# Altium footprint library aiskylab-01Resistors.PcbLib: 208 footprints (part 8 of 13)
Each footprint in its own frame and in the unit in brackets; x right, y up, seen from the top. Pads: shape width x height; smd on the part's side, far side on the other; paste and mask are expansions set on the pad; w line width, h text height; cw(c..) or ccw(c..) is an arc to the next point about the centre after c.
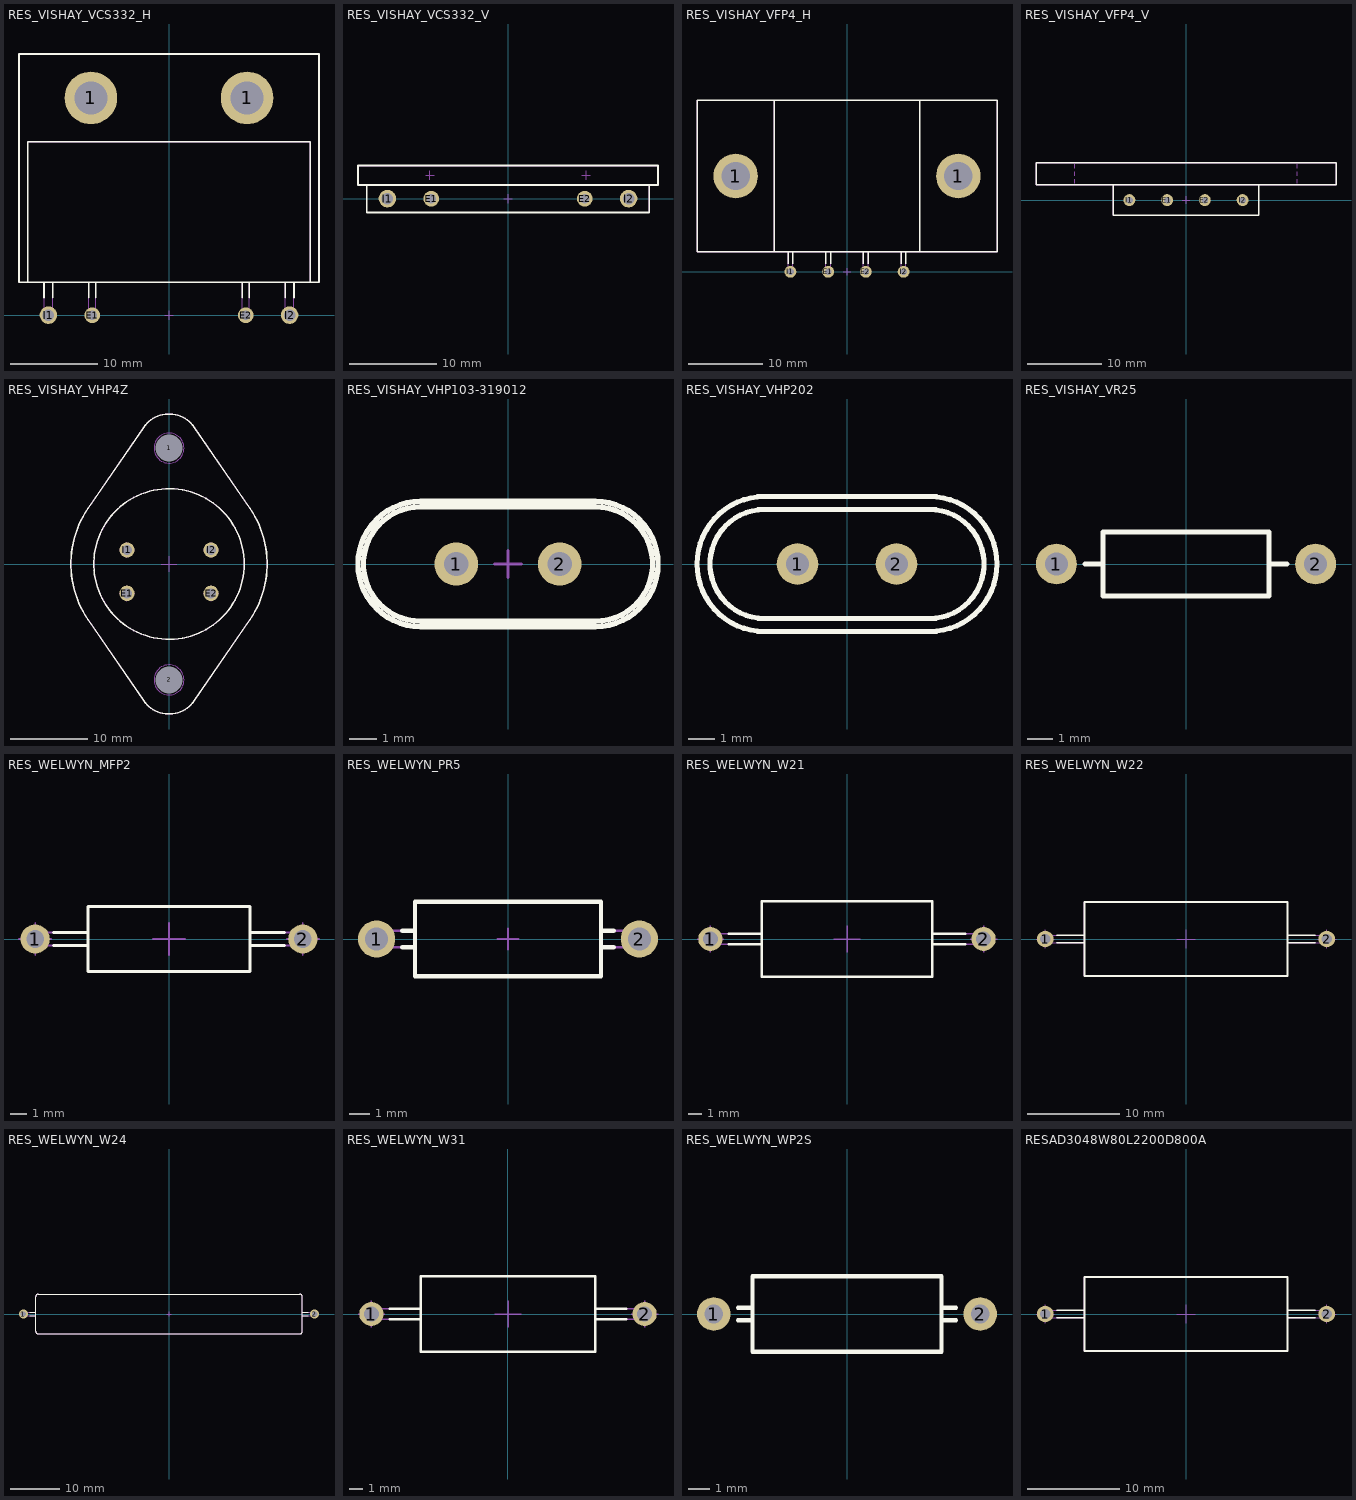
[diagram p7: the footprints below, top view; thin cyan lines are the x and y axes]

## RES_VISHAY_VCS332_H [mm] "4 Leads VISHAY VCS332 Case - Horizontal Mounting"
height 5.33
pads (6):
  round 6 hole 3.8: 1(-8.9,24.765) 1(8.9,24.765)
  round 1.8 hole 1.1: E1(-8.75,0) E2(8.75,0)
  round 2 hole 1.3: I1(-13.75,0) I2(13.75,0)
Top Overlay:
  lines w0.2: -16.1,3.765 -16.1,19.765 16.1,19.765 16.1,3.765 ; -14.25,2 -14.25,3.765 ; -13.25,2 -13.25,3.765 ; -9.15,2 -9.15,3.765 ; -8.35,2 -8.35,3.765 ; 8.35,2 8.35,3.765 ; 9.15,2 9.15,3.765 ; 13.25,2 13.25,3.765 ; 14.25,2 14.25,3.765 ; -17.1,3.765 17.1,3.765 17.1,29.765 -17.1,29.765 -17.1,3.765
Top Designator:
  text ".Designator" at -7.618,13.874 h1.52
Top Assembly:
  circle w0.1: c-8.9,24.765 r1.75
  circle w0.1: c8.9,24.765 r1.75
  lines w0.1: -16.1,3.765 -16.1,19.765 16.1,19.765 16.1,3.765 ; -14.25,3.765 -14.25,0 ccw(c-13.75,0) -13.25,0 -13.25,3.765 ; -9.15,3.765 -9.15,0 ccw(c-8.75,0) -8.35,0 -8.35,3.765 ; 8.35,3.765 8.35,0 ccw(c8.75,0) 9.15,0 9.15,3.765 ; 13.25,3.765 13.25,0 ccw(c13.75,0) 14.25,0 14.25,3.765 ; -17.1,3.765 -17.1,29.765 17.1,29.765 17.1,3.765 -17.1,3.765
Top Dimensions:
  lines w0.1: -14.25,0 -13.75,0 ; -13.75,-0.5 -13.75,0 ; -13.75,0.5 -13.75,0 ; -13.25,0 -13.75,0 ; -9.4,24.765 -8.9,24.765 ; -9.25,0 -8.75,0 ; -8.9,24.265 -8.9,24.765 ; -8.9,25.265 -8.9,24.765 ; -8.75,-0.5 -8.75,0 ; -8.75,0.5 -8.75,0 ; -8.4,24.765 -8.9,24.765 ; -8.25,0 -8.75,0 ; -0.5,0 0,0 ; 0,-0.5 0,0 ; 0,0.5 0,0 ; 0.5,0 0,0 ; 8.25,0 8.75,0 ; 8.4,24.765 8.9,24.765 ; 8.75,-0.5 8.75,0 ; 8.75,0.5 8.75,0 ; 8.9,24.265 8.9,24.765 ; 8.9,25.265 8.9,24.765 ; 9.25,0 8.75,0 ; 9.4,24.765 8.9,24.765 ; 13.25,0 13.75,0 ; 13.75,-0.5 13.75,0 ; 13.75,0.5 13.75,0 ; 14.25,0 13.75,0
3D body "v200-130.stp": height 0.02, standoff -1.65, extent 12.75,-1 14.75,1
3D body "v200-130.stp": height 0.02, standoff -1.65, extent 7.75,-1 9.75,1
3D body "v200-130.stp": height 0.02, standoff -1.65, extent -14.7,-1.075 -12.7,0.925
3D body "v200-130.stp": height 0.02, standoff -1.65, extent -9.75,-1 -7.75,1
3D body "RES_VISHAY_VCS332_h.stp": height 5.33, standoff -3.6, extent -17.1,-0.5 17.1,29.765

## RES_VISHAY_VCS332_V [mm] "4 Leads VISHAY VCS332 Case - Vertical Mounting"
height 31
pads (4):
  round 1.8 hole 1.1: E1(-8.75,0) E2(8.75,0)
  round 2 hole 1.3: I1(-13.75,0) I2(13.75,0)
Top Overlay:
  lines w0.2: -16.1,1.565 -16.1,-1.565 16.1,-1.565 16.1,1.565 ; -17.1,1.565 17.1,1.565 17.1,3.765 -17.1,3.765 -17.1,1.565
Top Designator:
  text ".Designator" at -7.618,0.592 h1.52
Top Assembly:
  lines w0.1: -16.1,1.565 -16.1,-1.565 16.1,-1.565 16.1,1.565 ; -17.1,1.565 -17.1,3.765 17.1,3.765 17.1,1.565 -17.1,1.565
Top Dimensions:
  lines w0.1: -14.25,0 -13.75,0 ; -13.75,-0.5 -13.75,0 ; -13.75,0.5 -13.75,0 ; -13.25,0 -13.75,0 ; -9.4,2.665 -8.9,2.665 ; -9.25,0 -8.75,0 ; -8.9,2.165 -8.9,2.665 ; -8.9,3.165 -8.9,2.665 ; -8.75,-0.5 -8.75,0 ; -8.75,0.5 -8.75,0 ; -8.4,2.665 -8.9,2.665 ; -8.25,0 -8.75,0 ; -0.5,0 0,0 ; 0,-0.5 0,0 ; 0,0.5 0,0 ; 0.5,0 0,0 ; 8.25,0 8.75,0 ; 8.4,2.665 8.9,2.665 ; 8.75,-0.5 8.75,0 ; 8.75,0.5 8.75,0 ; 8.9,2.165 8.9,2.665 ; 8.9,3.165 8.9,2.665 ; 9.25,0 8.75,0 ; 9.4,2.665 8.9,2.665 ; 13.25,0 13.75,0 ; 13.75,-0.5 13.75,0 ; 13.75,0.5 13.75,0 ; 14.25,0 13.75,0
3D body "v200-130.stp": height 0.02, standoff -1.65, extent -14.75,-1 -12.75,1
3D body "v200-130.stp": height 0.02, standoff -1.65, extent 12.75,-1 14.75,1
3D body "v200-130.stp": height 0.02, standoff -1.65, extent 7.75,-1 9.75,1
3D body "v200-130.stp": height 0.02, standoff -1.65, extent -9.75,-1 -7.75,1
3D body "RES_VISHAY_VCS332_v.stp": height 31, standoff -3.6, extent -17.1,-1.565 17.1,3.765

## RES_VISHAY_VFP4_H [mm] "4 Leads VFP4 VISHAY Case - Horizontal Mounting"
height 7.11
pads (6):
  round 6 hole 3.8: 1(-15,12.9) 1(15,12.9)
  round 1.6 hole 0.9: E1(-2.54,0) E2(2.54,0) I1(-7.62,0) I2(7.62,0)
Top Overlay:
  lines w0.2: -9.79,2.7 -9.79,23.1 ; -7.945,1.051 -7.945,2.7 ; -7.295,1.051 -7.295,2.7 ; -2.865,1.051 -2.865,2.7 ; -2.215,1.051 -2.215,2.7 ; 2.215,1.051 2.215,2.7 ; 2.865,1.051 2.865,2.7 ; 7.295,1.051 7.295,2.7 ; 7.945,1.051 7.945,2.7 ; 9.79,2.7 9.79,23.1 ; -20.21,2.7 -20.21,23.1 20.21,23.1 20.21,2.7 -20.21,2.7
Top Designator:
  text ".Designator" at -7.618,10.555 h1.52
Top Assembly:
  lines w0.1: -9.79,2.7 -9.79,23.1 ; -7.945,2.7 -7.945,0 ccw(c-7.62,0) -7.295,0 -7.295,2.7 ; -2.865,2.7 -2.865,0 ccw(c-2.54,0) -2.215,0 -2.215,2.7 ; 2.215,2.7 2.215,0 ccw(c2.54,0) 2.865,0 2.865,2.7 ; 7.295,2.7 7.295,0 ccw(c7.62,0) 7.945,0 7.945,2.7 ; 9.79,2.7 9.79,23.1 ; -20.21,2.7 -20.21,23.1 20.21,23.1 20.21,2.7 -20.21,2.7
Top Dimensions:
  lines w0.1: -15.5,12.9 -15,12.9 ; -15,12.4 -15,12.9 ; -15,13.4 -15,12.9 ; -14.5,12.9 -15,12.9 ; -8.12,0 -7.62,0 ; -7.62,-0.5 -7.62,0 ; -7.62,0.5 -7.62,0 ; -7.12,0 -7.62,0 ; -3.04,0 -2.54,0 ; -2.54,-0.5 -2.54,0 ; -2.54,0.5 -2.54,0 ; -2.04,0 -2.54,0 ; -0.5,0 0,0 ; 0,-0.5 0,0 ; 0,0.5 0,0 ; 0.5,0 0,0 ; 2.04,0 2.54,0 ; 2.54,-0.5 2.54,0 ; 2.54,0.5 2.54,0 ; 3.04,0 2.54,0 ; 7.12,0 7.62,0 ; 7.62,-0.5 7.62,0 ; 7.62,0.5 7.62,0 ; 8.12,0 7.62,0 ; 14.5,12.9 15,12.9 ; 15,12.4 15,12.9 ; 15,13.4 15,12.9 ; 15.5,12.9 15,12.9
3D body "v200-130.stp": height 0.02, standoff -1.65, extent -3.54,-1 -1.54,1
3D body "v200-130.stp": height 0.02, standoff -1.65, extent -8.62,-1 -6.62,1
3D body "v200-130.stp": height 0.02, standoff -1.65, extent 1.45,-1.075 3.45,0.925
3D body "v200-130.stp": height 0.02, standoff -1.65, extent 6.62,-1 8.62,1
3D body "RES_VISHAY_VFP-4_h.stp": height 7.11, standoff -3.6, extent -20.21,-0.325 20.21,23.1

## RES_VISHAY_VFP4_V [mm] "4 Leads VFP4 VISHAY Case - Vertical Mounting"
height 25.4
pads (4):
  round 1.6 hole 0.9: E1(-2.54,0) E2(2.54,0) I1(-7.62,0) I2(7.62,0)
Top Overlay:
  lines w0.2: -9.79,2.055 -9.79,-2.055 9.79,-2.055 9.79,2.055 ; -20.21,2.055 20.21,2.055 20.21,5.055 -20.21,5.055 -20.21,2.055
Top Designator:
  text ".Designator" at -7.618,0.992 h1.52
Top Assembly:
  lines w0.1: -9.79,2.055 -9.79,-2.055 9.79,-2.055 9.79,2.055 ; -20.21,2.055 -20.21,5.055 20.21,5.055 20.21,2.055 -20.21,2.055
Top Dimensions:
  lines w0.1: -15,2.305 -15,2.805 ; -15,3.305 -15,3.555 -15,3.805 ; -15,4.305 -15,4.805 ; -8.12,0 -7.62,0 ; -7.62,-0.5 -7.62,0 ; -7.62,0.5 -7.62,0 ; -7.12,0 -7.62,0 ; -3.04,0 -2.54,0 ; -2.54,-0.5 -2.54,0 ; -2.54,0.5 -2.54,0 ; -2.04,0 -2.54,0 ; -0.5,0 0,0 ; 0,-0.5 0,0 ; 0,0.5 0,0 ; 0.5,0 0,0 ; 2.04,0 2.54,0 ; 2.54,-0.5 2.54,0 ; 2.54,0.5 2.54,0 ; 3.04,0 2.54,0 ; 7.12,0 7.62,0 ; 7.62,-0.5 7.62,0 ; 7.62,0.5 7.62,0 ; 8.12,0 7.62,0 ; 15,2.305 15,2.805 ; 15,3.305 15,3.555 15,3.805 ; 15,4.305 15,4.805
3D body "v200-130.stp": height 0.02, standoff -1.65, extent -3.54,-1 -1.54,1
3D body "v200-130.stp": height 0.02, standoff -1.65, extent -8.62,-1 -6.62,1
3D body "v200-130.stp": height 0.02, standoff -1.65, extent 1.54,-1 3.54,1
3D body "v200-130.stp": height 0.02, standoff -1.65, extent 6.62,-1 8.62,1
3D body "RES_VISHAY_VFP-4_v.stp": height 25.4, standoff -3, extent -20.21,-2.055 20.21,5.055

## RES_VISHAY_VHP4Z [mm] "TO-3, 4 Leads VISHAY Case"
height 8.64
pads (6):
  round 1 hole 3.5 unplated: 1(0,15.065) 2(0,-15.065)
  round 2 hole 1.3: E1(-5.46,-3.815) E2(5.46,-3.815) I1(-5.46,1.825) I2(5.46,1.825)
Top Overlay:
  circle w0.2: c0,0 r9.779
  lines w0.2: -10.526,-7.221 cw(c0,0) -10.526,7.221 -3.299,17.758 cw(c0,15.495) 3.299,17.758 10.526,7.221 cw(c0,0) 10.526,-7.221 3.299,-17.758 cw(c0,-15.495) -3.299,-17.758 -10.526,-7.221
Top Designator:
  text ".Designator" at -7.618,-0.508 h1.52
Top Assembly:
  circle w0.1: c-5.46,-3.815 r0.5
  circle w0.1: c-5.46,1.825 r0.5
  circle w0.1: c5.46,-3.815 r0.5
  circle w0.1: c5.46,1.825 r0.5
  circle w0.1: c0,-15.065 r1.95
  circle w0.1: c0,15.065 r1.95
  circle w0.1: c0,0 r9.779
  lines w0.1: -10.526,-7.221 cw(c0,0) -10.526,7.221 -3.299,17.758 cw(c0,15.495) 3.299,17.758 10.526,7.221 cw(c0,0) 10.526,-7.221 3.299,-17.758 cw(c0,-15.495) -3.299,-17.758 -10.526,-7.221
Top Dimensions:
  lines w0.1: -6.46,-3.815 -5.46,-3.815 ; -6.46,1.825 -5.46,1.825 ; -5.46,-4.815 -5.46,-3.815 ; -5.46,-2.815 -5.46,-3.815 ; -5.46,0.825 -5.46,1.825 ; -5.46,2.825 -5.46,1.825 ; -4.46,-3.815 -5.46,-3.815 ; -4.46,1.825 -5.46,1.825 ; -1,-15.065 0,-15.065 ; -1,0 0,0 ; -1,15.065 0,15.065 ; 0,-16.065 0,-15.065 ; 0,-14.065 0,-15.065 ; 0,-1 0,0 ; 0,1 0,0 ; 0,14.065 0,15.065 ; 0,16.065 0,15.065 ; 1,-15.065 0,-15.065 ; 1,0 0,0 ; 1,15.065 0,15.065 ; 4.46,-3.815 5.46,-3.815 ; 4.46,1.825 5.46,1.825 ; 5.46,-4.815 5.46,-3.815 ; 5.46,-2.815 5.46,-3.815 ; 5.46,0.825 5.46,1.825 ; 5.46,2.825 5.46,1.825 ; 6.46,-3.815 5.46,-3.815 ; 6.46,1.825 5.46,1.825
3D body "v200-130.stp": height 0.02, standoff -1.65, extent -6.46,-4.815 -4.46,-2.815
3D body "v200-130.stp": height 0.02, standoff -1.65, extent -6.46,0.825 -4.46,2.825
3D body "v200-130.stp": height 0.02, standoff -1.65, extent 4.46,-4.815 6.46,-2.815
3D body "v200-130.stp": height 0.02, standoff -1.65, extent 4.46,0.825 6.46,2.825
3D body "RES_VISHAY_VHP4Z.stp": height 8.64, standoff -11.43, extent -12.765,-19.495 12.765,19.495

## RES_VISHAY_VHP103-319012 [mm] "Resistor, Radial, Pad spacing 5.08mm - Body 4.62mm X 11.05mm X 10.92mm H"
height 13.97
pads (2):
  round 1.6 hole 0.9: 1(-1.905,0) 2(1.905,0)
Top Overlay:
  lines w0.2: -3.215,-2.31 cw(c-3.215,0) -3.215,2.31 3.215,2.31 cw(c3.215,0) 3.215,-2.31 -3.215,-2.31 ; -3.215,-2.11 cw(c-3.215,0) -3.215,2.11 3.215,2.11 cw(c3.215,0) 3.215,-2.11 -3.215,-2.11
Top Designator:
  text ".Designator" at -7.618,-0.508 h1.52
Top Assembly:
  lines w0.1: -3.215,-2.31 cw(c-3.215,0) -3.215,2.31 3.215,2.31 cw(c3.215,0) 3.215,-2.31 -3.215,-2.31 ; -3.215,-2.11 cw(c-3.215,0) -3.215,2.11 3.215,2.11 cw(c3.215,0) 3.215,-2.11 -3.215,-2.11
Top Dimensions:
  lines w0.1: -2.395,0 -1.895,0 ; -1.895,-0.5 -1.895,0 ; -1.895,0.5 -1.895,0 ; -1.395,0 -1.895,0 ; -0.5,0 0,0 ; 0,-0.5 0,0 ; 0,0.5 0,0 ; 0.5,0 0,0 ; 1.395,0 1.895,0 ; 1.895,-0.5 1.895,0 ; 1.895,0.5 1.895,0 ; 2.395,0 1.895,0
3D body "v200-130.stp": height 0.02, standoff -1.65, extent 0.905,-1 2.905,1
3D body "v200-130.stp": height 0.02, standoff -1.65, extent -2.905,-1 -0.905,1
3D body "RES_VISHAY_VHP103-319012.stp": height 13.97, standoff -3.16, extent -5.525,-2.31 5.525,2.31

## RES_VISHAY_VHP202 [mm] "Resistor, Radial, Pad spacing 3.81mm - Body 5.21mm X 11.56mm X 13.84mm H"
height 11.43
pads (2):
  round 1.6 hole 0.9: 1(-1.905,0) 2(1.905,0)
Top Overlay:
  lines w0.2: -3.175,-2.6 cw(c-3.175,0) -3.175,2.6 3.175,2.6 cw(c3.175,0) 3.175,-2.6 -3.175,-2.6 ; -3.175,-2.1 cw(c-3.175,0) -3.175,2.1 3.175,2.1 cw(c3.175,0) 3.175,-2.1 -3.175,-2.1
Top Designator:
  text ".Designator" at -7.618,-0.508 h1.52
Top Assembly:
  circle w0.1: c-1.905,0 r0.6
  circle w0.1: c1.905,0 r0.6
  lines w0.1: -3.175,-2.6 cw(c-3.175,0) -3.175,2.6 3.175,2.6 cw(c3.175,0) 3.175,-2.6 -3.175,-2.6 ; -3.175,-2.1 cw(c-3.175,0) -3.175,2.1 3.175,2.1 cw(c3.175,0) 3.175,-2.1 -3.175,-2.1
3D body "v200-130.stp": height 0.02, standoff -1.65, extent 0.905,-1 2.905,1
3D body "v200-130.stp": height 0.02, standoff -1.65, extent -2.905,-1 -0.905,1
3D body "RES_VISHAY_VHP202.stp": height 13.84, standoff -3.6, extent -5.78,-2.6 5.77,2.6

## RES_VISHAY_VR25 [mm] "Resistor, Axial, Pad spacing 10.16 mm - Body Lengh 6.5mm X Body Diameter 2.5mm"
height 2.5
pads (2):
  round 1.6 hole 0.9: 1(-5.08,0) 2(5.08,0)
Top Overlay:
  lines w0.2: -3.95,0 -3.25,0 ; 3.25,0 3.95,0 ; -3.25,-1.25 3.25,-1.25 3.25,1.25 -3.25,1.25 -3.25,-1.25
Top Designator:
  text ".Designator" at -7.617,-0.508 h1.52
Top Assembly:
  lines w0.1: -3.95,0 -3.25,0 ; 3.25,0 3.95,0 ; -3.25,-1.25 -3.25,1.25 3.25,1.25 3.25,-1.25 -3.25,-1.25
3D body "v200-130.stp": height 0.02, standoff -1.65, extent -6.08,-1 -4.08,1
3D body "v200-130.stp": height 0.02, standoff -1.65, extent 4.08,-1 6.08,1
3D body "RES_VISHAY_VR25.stp": height 2.51, standoff -3.2, extent -5.38,-1.27 5.38,1.26

## RES_WELWYN_MFP2 [mm] "Resistor, Axial, Pad spacing 16.51 mm - Body Lengh 10mm X Body Diameter 4mm"
height 4
pads (2):
  round 1.8 hole 1.1: 1(-8.255,0) 2(8.255,0)
Top Overlay:
  lines w0.2: -7.124,-0.4 -5,-0.4 ; -7.124,0.4 -5,0.4 ; 5,-0.4 7.124,-0.4 ; 5,0.4 7.124,0.4 ; -5,-2 5,-2 5,2 -5,2 -5,-2
Top Designator:
  text ".Designator" at -7.618,-0.508 h1.52
Top Assembly:
  lines w0.1: -5,-0.4 -8.255,-0.4 cw(c-8.255,0) -8.255,0.4 -5,0.4 ; 5,-0.4 8.255,-0.4 ccw(c8.255,0) 8.255,0.4 5,0.4 ; -5,-2 -5,2 5,2 5,-2 -5,-2
Top Dimensions:
  lines w0.1: -9.255,0 -8.255,0 ; -8.255,-1 -8.255,0 ; -8.255,1 -8.255,0 ; -7.255,0 -8.255,0 ; -1,0 0,0 ; 0,-1 0,0 ; 0,1 0,0 ; 1,0 0,0 ; 7.255,0 8.255,0 ; 8.255,-1 8.255,0 ; 8.255,1 8.255,0 ; 9.255,0 8.255,0
3D body "v200-130.stp": height 0.02, standoff -1.65, extent 7.255,-1 9.255,1
3D body "v200-130.stp": height 0.02, standoff -1.65, extent -9.255,-1 -7.255,1
3D body "RES_WELWYN_MFP2.stp": height 4, standoff -3.1, extent -8.645,-1.95 8.665,2.05

## RES_WELWYN_PR5 [mm] "Resistor, Axial, Pad spacing 12.7mm - Body Lengh 9mm X Body Diameter 3.6mm"
height 3.6
pads (2):
  round 1.8 hole 1.1: 1(-6.35,0) 2(6.35,0)
Top Overlay:
  lines w0.2: -5.113,-0.4 -4.5,-0.4 ; -5.113,0.4 -4.5,0.4 ; 4.5,-0.4 5.113,-0.4 ; 4.5,0.4 5.113,0.4 ; -4.5,-1.8 4.5,-1.8 4.5,1.8 -4.5,1.8 -4.5,-1.8
Top Designator:
  text ".Designator" at -7.618,-0.508 h1.52
Top Assembly:
  lines w0.1: -4.5,-0.4 -6.35,-0.4 cw(c-6.35,0) -6.35,0.4 -4.5,0.4 ; 4.5,-0.4 6.35,-0.4 ccw(c6.35,0) 6.35,0.4 4.5,0.4 ; -4.5,-1.8 -4.5,1.8 4.5,1.8 4.5,-1.8 -4.5,-1.8
Top Dimensions:
  lines w0.1: -6.85,0 -6.35,0 ; -6.35,-0.5 -6.35,0 ; -6.35,0.5 -6.35,0 ; -5.85,0 -6.35,0 ; -0.5,0 0,0 ; 0,-0.5 0,0 ; 0,0.5 0,0 ; 0.5,0 0,0 ; 5.85,0 6.35,0 ; 6.35,-0.5 6.35,0 ; 6.35,0.5 6.35,0 ; 6.85,0 6.35,0
3D body "v200-130.stp": height 0.02, standoff -1.65, extent -7.35,-1 -5.35,1
3D body "v200-130.stp": height 0.02, standoff -1.65, extent 5.35,-1 7.35,1
3D body "RES_WELWYN_PR5.stp": height 3.6, standoff -3.6, extent -6.75,-1.8 6.75,1.8

## RES_WELWYN_W21 [mm] "Resistor, Axial, Leads spacing 20.32mm, Lead Dia. 0.8, Body Lengh 12.7mm, Diameter 5.6mm"
height 5.6
pads (2):
  round 1.8 hole 1.1: 1(-10.16,0) 2(10.16,0)
Top Overlay:
  lines w0.2: -8.8,-0.4 -6.35,-0.4 ; -8.8,0.4 -6.35,0.4 ; 6.35,-0.4 8.8,-0.4 ; 6.35,0.4 8.8,0.4 ; -6.35,-2.8 6.35,-2.8 6.35,2.8 -6.35,2.8 -6.35,-2.8
Top Designator:
  text ".Designator" at -7.618,-0.508 h1.52
Top Assembly:
  lines w0.1: -6.35,-0.4 -10.16,-0.4 cw(c-10.16,0) -10.16,0.4 -6.35,0.4 ; 6.35,-0.4 10.16,-0.4 ccw(c10.16,0) 10.16,0.4 6.35,0.4 ; -6.35,-2.8 -6.35,2.8 6.35,2.8 6.35,-2.8 -6.35,-2.8
Top Dimensions:
  lines w0.1: -11.16,0 -10.16,0 ; -10.16,-1 -10.16,0 ; -10.16,1 -10.16,0 ; -9.16,0 -10.16,0 ; -1,0 0,0 ; 0,-1 0,0 ; 0,1 0,0 ; 1,0 0,0 ; 9.16,0 10.16,0 ; 10.16,-1 10.16,0 ; 10.16,1 10.16,0 ; 11.16,0 10.16,0
3D body "v200-130.stp": height 0.02, standoff -1.65, extent -11.16,-1 -9.16,1
3D body "v200-130.stp": height 0.02, standoff -1.65, extent 9.16,-1 11.16,1
3D body "RES_WELWYN_W21.stp": height 5.6, standoff -3.8, extent -10.59,-2.8 10.59,2.8

## RES_WELWYN_W22 [mm] "Resistor, Axial, Leads spacing 30.48mm, Lead Dia. 0.8, Body Lengh 22mm, Diameter 8mm"
height 8
pads (2):
  round 1.8 hole 1.1: 1(-15.24,0) 2(15.24,0)
Top Overlay:
  lines w0.2: -14,-0.4 -11,-0.4 ; -14,0.4 -11,0.4 ; 11,-0.4 14,-0.4 ; 11,0.4 14,0.4 ; -11,-4 -11,4 11,4 11,-4 -11,-4
Top Designator:
  text ".Designator" at -7.618,-0.508 h1.52
Top Assembly:
  lines w0.1: -11,-0.4 -15.24,-0.4 cw(c-15.24,0) -15.24,0.4 -11,0.4 ; 11,-0.4 15.24,-0.4 ccw(c15.24,0) 15.24,0.4 11,0.4 ; -11,-4 -11,4 11,4 11,-4 -11,-4
Top Dimensions:
  lines w0.1: -16.24,0 -15.24,0 ; -15.24,-1 -15.24,0 ; -15.24,1 -15.24,0 ; -14.24,0 -15.24,0 ; -1,0 0,0 ; 0,-1 0,0 ; 0,1 0,0 ; 1,0 0,0 ; 14.24,0 15.24,0 ; 15.24,-1 15.24,0 ; 15.24,1 15.24,0 ; 16.24,0 15.24,0
3D body "v200-130.stp": height 0.02, standoff -1.65, extent -16.24,-1 -14.24,1
3D body "v200-130.stp": height 0.02, standoff -1.65, extent 14.24,-1 16.24,1
3D body "RESAD3048W80L2200D800A.stp": height 8, standoff -3.8, extent -15.64,-4 15.64,4

## RES_WELWYN_W24 [mm] "Resistor, Axial, Pad spacing 58.42mm - Body Lengh 53.5mm X Body Diameter 8mm"
height 8
pads (2):
  round 1.8 hole 1.1: 1(-29.21,0) 2(29.21,0)
Top Overlay:
  lines w0.2: -27.973,-0.4 -26.75,-0.4 ; -27.973,0.4 -26.75,0.4 ; 26.75,-0.4 27.973,-0.4 ; 26.75,0.4 27.973,0.4 ; -26.75,-3.5 ccw(c-26.25,-3.5) -26.25,-4 26.25,-4 ccw(c26.25,-3.5) 26.75,-3.5 26.75,3.5 ccw(c26.25,3.5) 26.25,4 -26.25,4 ccw(c-26.25,3.5) -26.75,3.5 -26.75,-3.5
Top Designator:
  text ".Designator" at -7.618,-0.508 h1.52
Top Assembly:
  lines w0.1: -26.75,-0.4 -29.21,-0.4 cw(c-29.21,0) -29.21,0.4 -26.75,0.4 ; 26.75,-0.4 29.21,-0.4 ccw(c29.21,0) 29.21,0.4 26.75,0.4 ; -26.75,-3.5 ccw(c-26.25,-3.5) -26.25,-4 26.25,-4 ccw(c26.25,-3.5) 26.75,-3.5 26.75,3.5 ccw(c26.25,3.5) 26.25,4 -26.25,4 ccw(c-26.25,3.5) -26.75,3.5 -26.75,-3.5
Top Dimensions:
  lines w0.1: -29.21,0 -29.21,0.5 -29.21,0 ; -29.21,0 -28.71,0 -29.21,0 ; -29.21,0 -29.21,-0.5 -29.21,0 ; -29.21,0 -29.71,0 -29.21,0 ; 0,0 0,0.5 0,0 ; 0,0 0.5,0 0,0 ; 0,0 0,-0.5 0,0 ; 0,0 -0.5,0 0,0 ; 29.21,0 29.21,0.5 29.21,0 ; 29.21,0 29.71,0 29.21,0 ; 29.21,0 29.21,-0.5 29.21,0 ; 29.21,0 28.71,0 29.21,0
3D body "v200-130.stp": height 0.02, standoff -1.65, extent -30.21,-1 -28.21,1
3D body "v200-130.stp": height 0.02, standoff -1.65, extent 28.21,-1 30.21,1
3D body "RES_WELWYN_W24.stp": height 8, standoff -3.6, extent -29.61,-4 29.61,4

## RES_WELWYN_W31 [mm] "Resistor, Axial, Leads spacing 20.32mm, Lead Dia. 0.8, Body Lengh 13mm, Diameter 5.6mm"
height 5.6
pads (2):
  round 1.8 hole 1.1: 1(-10.16,0) 2(10.16,0)
Top Overlay:
  lines w0.2: -8.8,-0.4 -6.5,-0.4 ; -8.8,0.4 -6.5,0.4 ; 6.5,-0.4 8.8,-0.4 ; 6.5,0.4 8.8,0.4 ; -6.5,-2.8 -6.5,2.8 6.5,2.8 6.5,-2.8 -6.5,-2.8
Top Designator:
  text ".Designator" at -7.617,-0.508 h1.52
Top Assembly:
  lines w0.1: -6.5,-0.4 -10.16,-0.4 cw(c-10.16,0) -10.16,0.4 -6.5,0.4 ; 6.5,-0.4 10.16,-0.4 ccw(c10.16,0) 10.16,0.4 6.5,0.4 ; -6.5,-2.8 -6.5,2.8 6.5,2.8 6.5,-2.8 -6.5,-2.8
Top Dimensions:
  lines w0.1: -11.16,0 -10.16,0 ; -10.16,-1 -10.16,0 ; -10.16,1 -10.16,0 ; -9.16,0 -10.16,0 ; -1,0 0,0 ; 0,-1 0,0 ; 0,1 0,0 ; 1,0 0,0 ; 9.16,0 10.16,0 ; 10.16,-1 10.16,0 ; 10.16,1 10.16,0 ; 11.16,0 10.16,0
3D body "v200-130.stp": height 0.02, standoff -1.65, extent -11.16,-1 -9.16,1
3D body "v200-130.stp": height 0.02, standoff -1.65, extent 9.16,-1 11.16,1
3D body "RES_WELWYN_W31.stp": height 5.6, standoff -3.8, extent -10.59,-2.8 10.59,2.8

## RES_WELWYN_WP2S [mm] "Resistor, Axial, Pad spacing 12.7 mm - Body Lengh 9mm X Body Diameter 3.6mm"
height 3.6
pads (2):
  round 1.6 hole 0.9: 1(-6.35,0) 2(6.35,0)
Top Overlay:
  lines w0.2: -5.2,-0.3 -4.5,-0.3 ; -5.2,0.3 -4.5,0.3 ; 4.5,-0.3 5.2,-0.3 ; 4.5,0.3 5.2,0.3 ; -4.5,-1.8 -4.5,1.8 4.5,1.8 4.5,-1.8 -4.5,-1.8
Top Designator:
  text ".Designator" at -7.617,-0.508 h1.52
Top Assembly:
  lines w0.1: -5.2,-0.3 -4.5,-0.3 ; -5.2,0.3 -4.5,0.3 ; 4.5,-0.3 5.2,-0.3 ; 4.5,0.3 5.2,0.3 ; -4.5,-1.8 -4.5,1.8 4.5,1.8 4.5,-1.8 -4.5,-1.8
3D body "v200-130.stp": height 0.02, standoff -1.65, extent -7.35,-1 -5.35,1
3D body "v200-130.stp": height 0.02, standoff -1.65, extent 5.35,-1 7.35,1
3D body "RES_WELWYN_WP2S.stp": height 3.6, standoff -3.6, extent -6.65,-1.8 6.65,1.8

## RESAD3048W80L2200D800A [mm] "Resistor, Axial, Leads spacing 30.48mm, Lead Dia. 0.8, Body Lengh 22mm, Diameter 8mm"
height 8
pads (2):
  round 1.8 hole 1.1: 1(-15.24,0) 2(15.24,0)
Top Overlay:
  lines w0.2: -14,-0.4 -11,-0.4 ; -14,0.4 -11,0.4 ; 11,-0.4 14,-0.4 ; 11,0.4 14,0.4 ; -11,-4 -11,4 11,4 11,-4 -11,-4
Top Designator:
  text ".Designator" at -7.618,-0.508 h1.52
Top Assembly:
  lines w0.1: -11,-0.4 -15.24,-0.4 cw(c-15.24,0) -15.24,0.4 -11,0.4 ; 11,-0.4 15.24,-0.4 ccw(c15.24,0) 15.24,0.4 11,0.4 ; -11,-4 -11,4 11,4 11,-4 -11,-4
Top Dimensions:
  lines w0.1: -16.24,0 -15.24,0 ; -15.24,-1 -15.24,0 ; -15.24,1 -15.24,0 ; -14.24,0 -15.24,0 ; -1,0 0,0 ; 0,-1 0,0 ; 0,1 0,0 ; 1,0 0,0 ; 14.24,0 15.24,0 ; 15.24,-1 15.24,0 ; 15.24,1 15.24,0 ; 16.24,0 15.24,0
3D body "v200-130.stp": height 0.02, standoff -1.65, extent -16.24,-1 -14.24,1
3D body "v200-130.stp": height 0.02, standoff -1.65, extent 14.24,-1 16.24,1
3D body "RESAD3048W80L2200D800A.stp": height 8, standoff -3.8, extent -15.64,-4 15.64,4